# Altium footprint library Misc.PCBLIB: 128 footprints (part 2 of 8)
Each footprint in its own frame and in the unit in brackets; x right, y up, seen from the top. Pads: shape width x height; smd on the part's side, far side on the other; paste and mask are expansions set on the pad; w line width, h text height; cw(c..) or ccw(c..) is an arc to the next point about the centre after c.
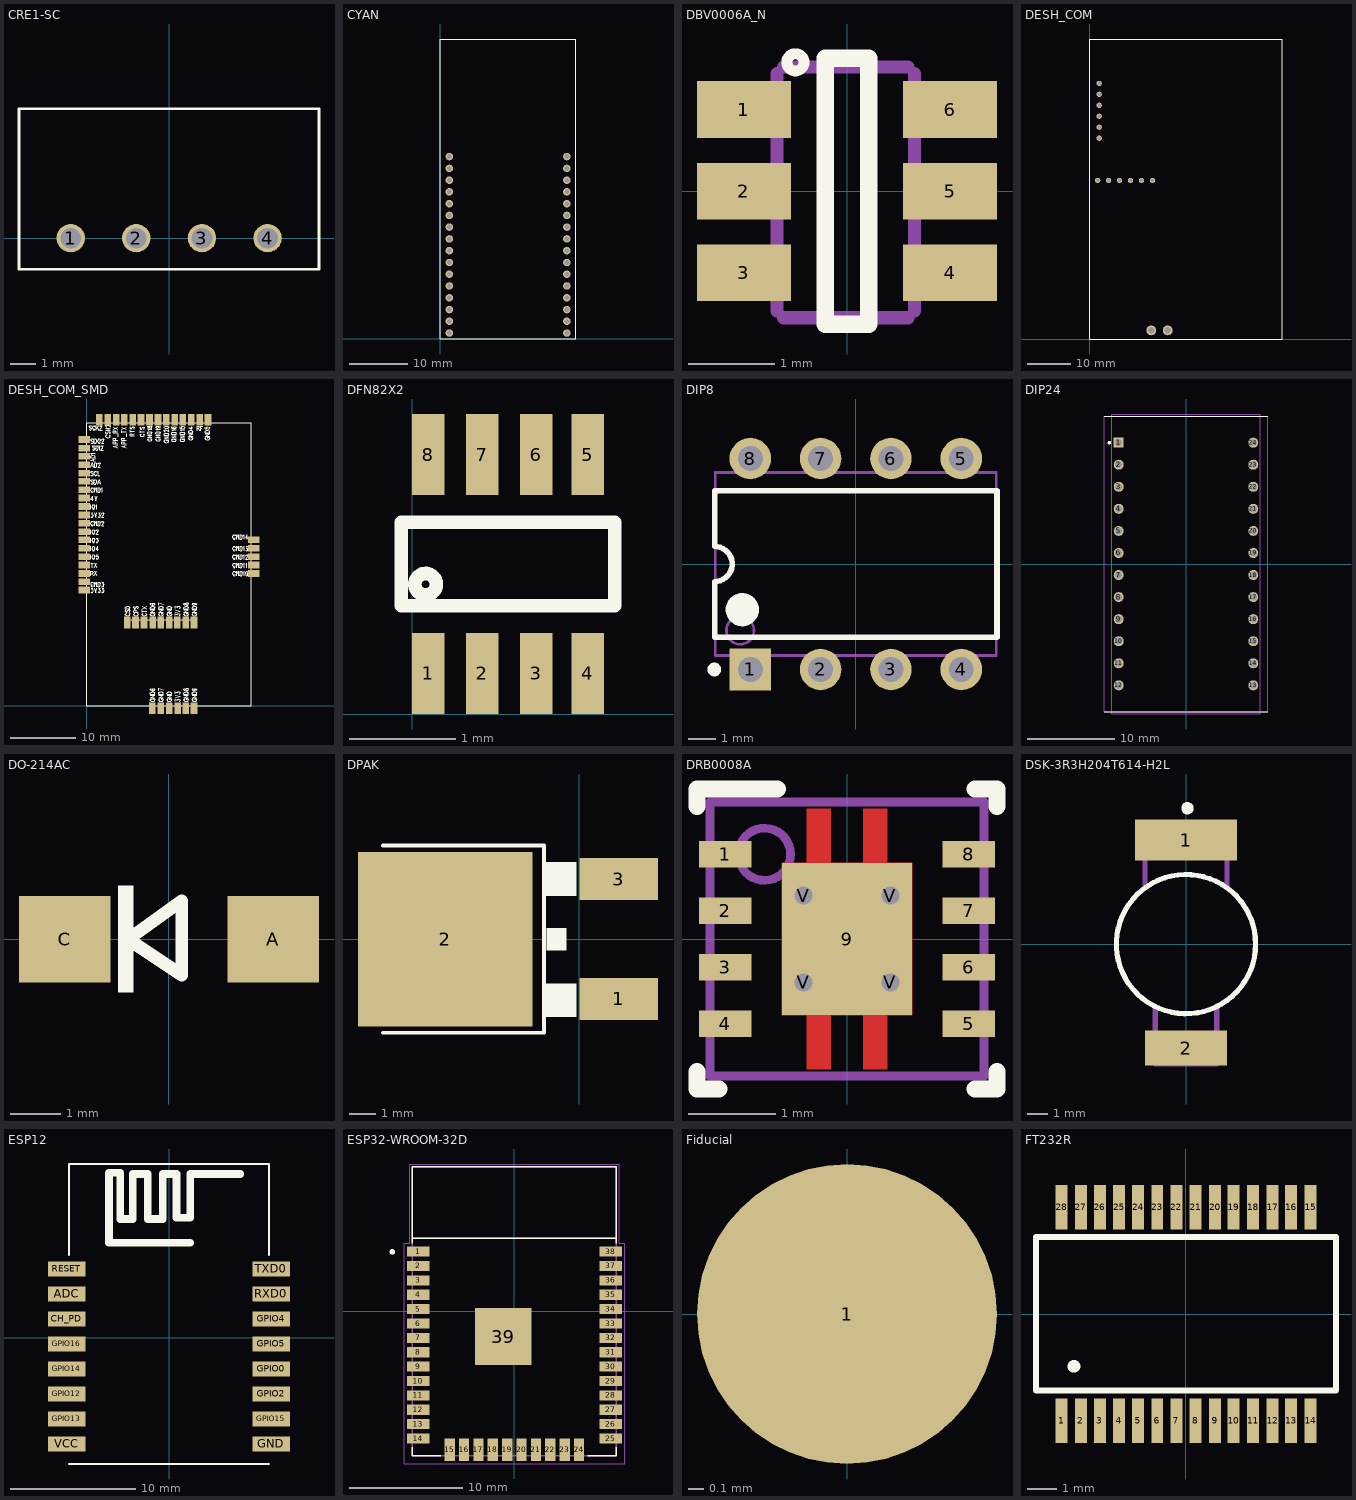
[diagram p1: the footprints below, top view; thin cyan lines are the x and y axes]

## CRE1-SC [mm] "DC_DC isolated converter"
pads (4):
  round 1.1 hole 0.8: 1(-3.81,0) 2(-1.27,0) 3(1.27,0) 4(3.81,0)
Top Overlay:
  lines w0.1: -5.81,-1.2 0.19,-1.2 5.8,-1.2 5.8,5 -5.81,5 -5.81,0 -5.81,-1.2
3D body "mps_dcdc_cme_sc_a.STEP": height 10, standoff -4.1, extent -5.75,-1.12 5.75,4.9

## CYAN [mil]
pads (32):
  round 50 hole 32: J1.1(847,40) J1.2(847,119) J1.3(847,197) J1.4(847,276) J1.5(847,355) J1.6(847,434) J1.7(847,512) J1.8(847,591) J1.9(847,670) J1.10(847,749) J1.11(847,827) J1.12(847,906) J1.13(847,985) J1.14(847,1063) J1.15(847,1142) J1.16(847,1221) J2.1(60,40) J2.2(60,119) J2.3(60,197) J2.4(60,276) J2.5(60,355) J2.6(60,434) J2.7(60,512) J2.8(60,591) J2.9(60,670) J2.10(60,749) J2.11(60,827) J2.12(60,906) J2.13(60,985) J2.14(60,1063) J2.15(60,1142) J2.16(60,1221)
Top Overlay:
  lines w5: 0,0 906,0 906,2008 0,2008 0,0

## DBV0006A_N [mil]
pads (6):
  rect 43x26 smd: 1(-47.24,37.4) 2(-47.24,0) 3(-47.24,-37.4) 4(47.24,-37.4) 5(47.24,0) 6(47.24,37.4)
Top Overlay:
  circle w5: c-23.62,59.06 r3.94
  lines w8: -10,-61 10,-61 10,61 -10,61 -10,-61
Mechanical 4:
  lines w0: -32,-55 ccw(c-28.95,-54.95) -29,-58 ; -32,54 cw(c-28.95,53.95) -29,57 ; 28,-58 ccw(c27.95,-54.95) 31,-55 ; 28,57 cw(c27.95,53.95) 31,54
  lines w6: -32,-55 -32,-46 ; -32,54 -32,45 ; -29,-58 28,-58 ; -29,57 28,57 ; 31,-55 31,-46 ; 31,54 31,45 ; -32,-46 -32,-30 ; -32,-46 -56,-46 -56,-30 -32,-30 ; -32,-30 -32,-8 ; -32,-8 -32,7 ; -32,-8 -56,-8 -56,7 -32,7 ; -32,7 -32,29 ; -32,29 -32,45 ; -32,29 -56,29 -56,45 -32,45 ; 31,-46 31,-30 ; 31,-46 56,-46 56,-30 31,-30 ; 31,-30 31,-8 ; 31,-8 56,-8 56,7 31,7 ; 31,-8 31,7 ; 31,7 31,29 ; 31,29 31,45 ; 31,29 56,29 56,45 31,45
3D body "User Library-sot236.step": height 39.37, standoff 0, extent -46.06,-57.48 46.07,57.48

## DESH_COM [mil]
pads (14):
  round 48 hole 32: H1(570,1447) H2(470,1447) H3(370,1447) H4(270,1447) H5(170,1447) H6(70,1447) V1(84,2332) V2(84,2232) V3(84,2132) V4(84,2032) V5(84,1932) V6(84,1832)
  round 90 hole 60: P$1(559,79) P$2(709,79)
Top Overlay:
  lines w5: 0,0 1752,0 1752,2737 0,2737 0,0

## DESH_COM_SMD [mil]
pads (53):
  rect 40x70 smd: 3V3_1(544,-15.75) 3V3_2(542,497) APP_RX(176,1709) APP_TX(225,1709) CPS(292,497) CSD(243,497) CSN2(125,1709) CTS(325,1709) CTX(343,497) GND4(626,1709) GND5(725,1709) GND6_1(392,-15.75) GND6_2(394,497) GND7_1(443,-15.75) GND7_2(443,497) GND8_1(593,-15.75) GND8_2(593,497) GND9_1(642,-15.75) GND9_2(642,497) GND15(575,1709) GND16(526,1709) GND18(375,1709) GND19(426,1709) GND20(475,1709) GND_1(493,-15.75) GND_2(493,497) RF(676,1709) RTS(276,1709) SCK2(75,1709)
  rect 70x40 smd: 3V32(-15.75,1140) 3V33(-15.75,691) 4V(-15.75,1241) AD1(-15.75,1491) AD2(-15.75,1441) GND1(-15.75,1290) GND2(-15.75,1091) GND3(-15.75,741) GND10(1000,790) GND11(1000,841) GND12(1000,890) GND13(1000,941) GND14(1000,991) IO1(-15.75,1191) IO2(-15.75,1040) IO3(-15.75,991) IO4(-15.75,941) IO5(-15.75,890) RX(-15.75,790) SCL(-15.75,1390) SDA(-15.75,1341) SDI2(-15.75,1540) SDO2(-15.75,1591) TX(-15.75,841)
Top Overlay:
  drawing of 2335 lines, arcs and shapes, not listed

## DFN82X2 [mil]
pads (8):
  rect 12x30 smd: 1(6,15) 2(26,15) 3(46,15) 4(65,15) 5(65,96) 6(46,96) 7(26,96) 8(6,96)
Top Overlay:
  circle w5: c5,48 r4
  lines w5: -3.94,40 -3.94,71 75,71 75,40 -3.94,40

## DIP8 [mm]
pads (8):
  rect 1.5x1.5 hole 0.9: 1(-3.81,-3.81)
  round 1.5 hole 0.9: 2(-1.27,-3.81) 3(1.27,-3.81) 4(3.81,-3.81) 5(3.81,3.81) 6(1.27,3.81) 7(-1.27,3.81) 8(-3.81,3.81)
Top Overlay:
  circle w0.25: c-5.11,-3.81 r0.125
  circle w0.6: c-4.1,-1.65 r0.3
  lines w0.2: -5.1,-2.65 5.1,-2.65 5.1,2.65 -5.1,2.65 -5.1,0.635 cw(c-5.1,0) -5.1,-0.635 -5.1,-2.65
Mechanical 13:
  circle w0.1: c-4.175,-2.4 r0.5
  lines w0.1: -5.075,-3.3 5.075,-3.3 5.075,3.3 -5.075,3.3 -5.075,-3.3
3D body "pdip8_p2-54x7-62_l10-16_w6-4.stp": height 4.61, standoff -3.41, extent -5.08,-3.935 5.08,3.935

## DIP24 [mm]
pads (24):
  rect 1.15x1.15 hole 0.8: 1(-7.748,13.97)
  round 1.15 hole 0.8: 2(-7.748,11.43) 3(-7.748,8.89) 4(-7.748,6.35) 5(-7.748,3.81) 6(-7.748,1.27) 7(-7.748,-1.27) 8(-7.748,-3.81) 9(-7.748,-6.35) 10(-7.748,-8.89) 11(-7.748,-11.43) 12(-7.748,-13.97) 13(7.748,-13.97) 14(7.748,-11.43) 15(7.748,-8.89) 16(7.748,-6.35) 17(7.748,-3.81) 18(7.748,-1.27) 19(7.748,1.27) 20(7.748,3.81) 21(7.748,6.35) 22(7.748,8.89) 23(7.748,11.43) 24(7.748,13.97)
Top Overlay:
  circle w0.2: c-8.822,13.97 r0.1
  lines w0.127: -9.4,-17.02 9.4,-17.02 ; -9.4,17.02 9.4,17.02
Mechanical 13:
  circle w0.2: c-8.822,13.97 r0.1
  lines w0.127: -9.4,-17.02 9.4,-17.02 9.4,17.02 -9.4,17.02 -9.4,-17.02
Mechanical 15:
  lines w0.05: -8.572,-17.27 8.572,-17.27 8.572,17.27 -8.572,17.27 -8.572,-17.27

## DO-214AC [mil]
pads (2):
  rect 71x67 smd: A(81,0) C(-80.71,0)
Top Overlay:
  rectangle: -39.37,-41.34 -27.56,42
  lines w10: -31.5,0 10,30 10,-27.56 -31.5,0

## DPAK [mil]
pads (3):
  rect 119x63 smd: 1(60,-90.55) 3(60,91)
  rect 264x264 smd: 2(-202.76,0)
Top Overlay:
  rectangle: -55.12,65 -3.94,117
  rectangle: -55.12,-118.11 -3.94,-66.93
  region: -19.19,-17 -19.19,17 -49.19,17 -49.19,-17
  lines w5.91: -297.06,-141.72 -53.19,-141.74 -53.19,141.73 -76.31,141.73 -91.03,141.73 -122.02,141.73 -228.21,141.72 -228.22,141.73 -297.06,141.72
3D body "User Library-DPAK-1.step": height 94.19, standoff -0.89, extent -337.3,-129.52 53.97,127.96
3D body "User Library-DPAK-1.step": height 94.19, standoff -0.89, extent -335.72,-128.74 55.55,128.74

## DRB0008A [mm]
pads (13):
  rect 0.6x0.3 smd paste+0 mask+0.051: 1(-1.4,0.975) 2(-1.4,0.325) 3(-1.4,-0.325) 4(-1.4,-0.975) 5(1.4,-0.975) 6(1.4,-0.325) 7(1.4,0.325) 8(1.4,0.975)
  rect 1.5x1.75 smd paste-0.862 mask+0.051: 9(0,0)
  round 0.5 / inner round 1.524 / far side round 0.5 hole 0.203 mask+0.051: V(-0.5,-0.5) V(-0.5,0.5) V(0.5,-0.5) V(0.5,0.5)
Top Layer:
  region: -0.185,-1.5 -0.465,-1.5 -0.465,-0.875 -0.75,-0.875 -0.75,0.875 -0.465,0.875 -0.465,1.5 -0.185,1.5 -0.185,0.875 0.185,0.875 0.185,1.5 0.465,1.5 0.465,0.875 0.75,0.875 0.75,-0.875 0.465,-0.875 0.465,-1.5 0.185,-1.5 0.185,-0.875 -0.185,-0.875
Top Overlay:
  lines w0.2: -1.725,-1.525 -1.725,-1.725 -1.475,-1.725 ; -1.725,1.525 -1.725,1.725 -0.8,1.725 ; 1.475,-1.725 1.725,-1.725 1.725,-1.525 ; 1.475,1.725 1.725,1.725 1.725,1.525
Top Paste:
  region: -0.691,0.793 -0.691,-0.793 0.692,-0.793 0.692,0.793
Top Solder:
  region: -0.185,-1.551 -0.465,-1.551 -0.475,-1.55 -0.484,-1.547 -0.493,-1.542 -0.501,-1.536 -0.507,-1.528 -0.512,-1.519 -0.515,-1.51 -0.516,-1.5 -0.516,-0.926 -0.75,-0.926 -0.76,-0.925 -0.769,-0.922 -0.778,-0.917 -0.786,-0.911 -0.792,-0.903 -0.797,-0.894 -0.8,-0.885 -0.801,-0.875 -0.801,0.875 -0.8,0.885 -0.797,0.894 -0.792,0.903 -0.786,0.911 -0.778,0.917 -0.769,0.922 -0.76,0.925 -0.75,0.926 -0.516,0.926 -0.516,1.5 -0.515,1.51 -0.512,1.519 -0.507,1.528 -0.501,1.536 -0.493,1.542 -0.484,1.547 -0.475,1.55 -0.465,1.551 -0.185,1.551 -0.175,1.55 -0.166,1.547 -0.157,1.542 -0.149,1.536 -0.143,1.528 -0.138,1.519 -0.135,1.51 -0.134,1.5 -0.134,0.926 0.134,0.926 0.134,1.5 0.135,1.51 0.138,1.519 0.143,1.528 0.149,1.536 0.157,1.542 0.166,1.547 0.175,1.55 0.185,1.551 0.465,1.551 0.475,1.55 0.484,1.547 0.493,1.542 0.501,1.536 0.507,1.528 0.512,1.519 0.515,1.51 0.516,1.5 0.516,0.926 0.75,0.926 0.76,0.925 0.769,0.922 0.778,0.917 0.786,0.911 0.792,0.903 0.797,0.894 0.8,0.885 0.801,0.875 0.801,-0.875 0.8,-0.885 0.797,-0.894 0.792,-0.903 0.786,-0.911 0.778,-0.917 0.769,-0.922 0.76,-0.925 0.75,-0.926 0.516,-0.926 0.516,-1.5 0.515,-1.51 0.512,-1.519 0.507,-1.528 0.501,-1.536 0.493,-1.542 0.484,-1.547 0.475,-1.55 0.465,-1.551 0.185,-1.551 0.175,-1.55 0.166,-1.547 0.157,-1.542 0.149,-1.536 0.143,-1.528 0.138,-1.519 0.135,-1.51 0.134,-1.5 0.134,-0.926 -0.134,-0.926 -0.134,-1.5 -0.135,-1.51 -0.138,-1.519 -0.143,-1.528 -0.149,-1.536 -0.157,-1.542 -0.166,-1.547 -0.175,-1.55
Mechanical 4:
  circle w0.1: c-0.95,0.975 r0.3
  lines w0.1: -1.575,-1.575 -1.575,1.575 1.575,1.575 1.575,-1.575 -1.575,-1.575
3D body: height 0.25, standoff 0, extent 0,0 0.254,0.254

## DSK-3R3H204T614-H2L [mm]
pads (2):
  rect 5x2 smd: 1(0,5.075)
  rect 4x1.7 smd: 2(0,-5.075)
Top Overlay:
  circle w0.3: c0.073,6.635 r0.153
  circle w0.254: c0,0 r3.4
  circle w0.254: c0,0 r3.4
Mechanical 4:
  lines w0.254: -2,2.749 -2,5.85 ; -1.5,-5.85 -1.5,-3.051 ; 1.5,-5.85 1.5,-3.038 ; 2,2.749 2,5.85
Mechanical 15:
  lines w0.254: -2,5.85 2,5.85 ; -1.5,-5.85 1.5,-5.85

## ESP12 [mm] "Wifi module ESP12"
pads (16):
  rect 3x1.2 smd: ADC(-8.205,3.485) CH_PD(-8.205,1.485) GND(8.195,-8.515) GPIO0(8.195,-2.515) GPIO2(8.195,-4.515) GPIO4(8.195,1.485) GPIO5(8.195,-0.515) GPIO12(-8.205,-4.515) GPIO13(-8.205,-6.515) GPIO14(-8.205,-2.515) GPIO15(8.195,-6.515) GPIO16(-8.205,-0.515) RESET(-8.205,5.485) RXD0(8.195,3.485) TXD0(8.195,5.485) VCC(-8.205,-8.515)
Top Overlay:
  lines w0.127: -8.005,-10.115 7.995,-10.115 ; -8.005,6.585 -8.005,13.885 7.995,13.885 7.995,6.585
  lines w0.61: -4.805,8.185 -4.805,7.585 1.695,7.585 ; -4.805,8.285 -4.805,13.185 -3.905,13.185 -3.905,9.485 -2.905,9.485 -2.905,13.085 -1.705,13.085 -1.705,9.485 -0.505,9.485 -0.505,13.085 0.595,13.085 0.595,9.585 1.695,9.585 1.695,13.085 5.695,13.085
3D body "User Library-EPS8266 ESP-12E.step": height 2.65, standoff -0.04, extent -8.056,-9.998 7.954,14.007

## ESP32-WROOM-32D [mm]
pads (39):
  rect 2x0.9 smd: 1(-8.5,5.26) 2(-8.5,3.99) 3(-8.5,2.72) 4(-8.5,1.45) 5(-8.5,0.18) 6(-8.5,-1.09) 7(-8.5,-2.36) 8(-8.5,-3.63) 9(-8.5,-4.9) 10(-8.5,-6.17) 11(-8.5,-7.44) 12(-8.5,-8.71) 13(-8.5,-9.98) 14(-8.5,-11.25) 25(8.5,-11.25) 26(8.5,-9.98) 27(8.5,-8.71) 28(8.5,-7.44) 29(8.5,-6.17) 30(8.5,-4.9) 31(8.5,-3.63) 32(8.5,-2.36) 33(8.5,-1.09) 34(8.5,0.18) 35(8.5,1.45) 36(8.5,2.72) 37(8.5,3.99) 38(8.5,5.26)
  rect 0.9x2 smd: 15(-5.715,-12.25) 16(-4.445,-12.25) 17(-3.175,-12.25) 18(-1.905,-12.25) 19(-0.635,-12.25) 20(0.635,-12.25) 21(1.905,-12.25) 22(3.175,-12.25) 23(4.445,-12.25) 24(5.715,-12.25)
  rect 5x5 smd: 39(-1,-2.24)
Top Overlay:
  circle w0.3: c-10.777,5.238 r0.1
  lines w0.127: -9,-12 -9,-12.75 -6.5,-12.75 ; -9,6 -9,12.75 9,12.75 9,6 ; -8.96,6.45 8.96,6.45 ; 6.5,-12.75 9,-12.75 9,-12
Top Paste:
  region: -2.584,-0.659 0.581,-0.659 0.581,-3.825 -2.584,-3.825
Mechanical 4:
  circle w0.3: c-8.277,5.238 r0.1
  circle w0.3: c-8.277,5.238 r0.1
  lines w0.127: -9,-12.75 -9,12.75 ; -9,-12.75 9,-12.75 ; -9,-12.75 -9,12.75 ; -9,-12.75 9,-12.75 ; -9,12.75 9,12.75 ; -9,12.75 9,12.75 ; 9,-12.75 9,12.75 ; 9,-12.75 9,12.75 ; -8.96,6.45 8.96,6.45 -8.96,6.45
  text "ANTENNA" at -5.725,8.401 h1.88
  text "ANTENNA" at -5.725,8.401 h1.88
Mechanical 16:
  lines w0.05: -9.75,-13.5 -9.75,6 -9.25,6 -9.25,13 9.25,13 9.25,6 9.75,6 9.75,-13.5 -9.75,-13.5

## Fiducial [mm]
pads (1):
  rrect100% 2x2 smd paste-0.5 mask-0.5: 1(0,0)

## FT232R [mil]
pads (28):
  rect 16x60 smd: 1(-166.34,-142.72) 2(-140.75,-142.72) 3(-115.16,-142.72) 4(-89.57,-142.72) 5(-63.98,-142.72) 6(-38.39,-142.72) 7(-12.8,-142.72) 8(13,-142.72) 9(39,-142.72) 10(64,-142.72) 11(90,-142.72) 12(116,-142.72) 13(141,-142.72) 14(167,-142.72) 15(167,143) 16(141,143) 17(116,143) 18(90,143) 19(64,143) 20(39,143) 21(13,143) 22(-12.8,143) 23(-38.39,143) 24(-63.98,143) 25(-89.57,143) 26(-115.16,143) 27(-140.75,143) 28(-166.34,143)
Top Overlay:
  circle w15: c-150,-70 r1
  lines w8: -200.79,-102.36 201,-102.36 201,103 -200.79,103 ; -200.79,-100 -200.79,100
3D body "SSOP-28-TI-DB.STEP": height 77.76, standoff 0, extent -200.78,-153.95 200.79,153.96